# Altium footprint library PassiveComponents.PcbLib: 111 footprints (part 5 of 7)
Each footprint in its own frame and in the unit in brackets; x right, y up, seen from the top. Pads: shape width x height; smd on the part's side, far side on the other; paste and mask are expansions set on the pad; w line width, h text height; cw(c..) or ccw(c..) is an arc to the next point about the centre after c.
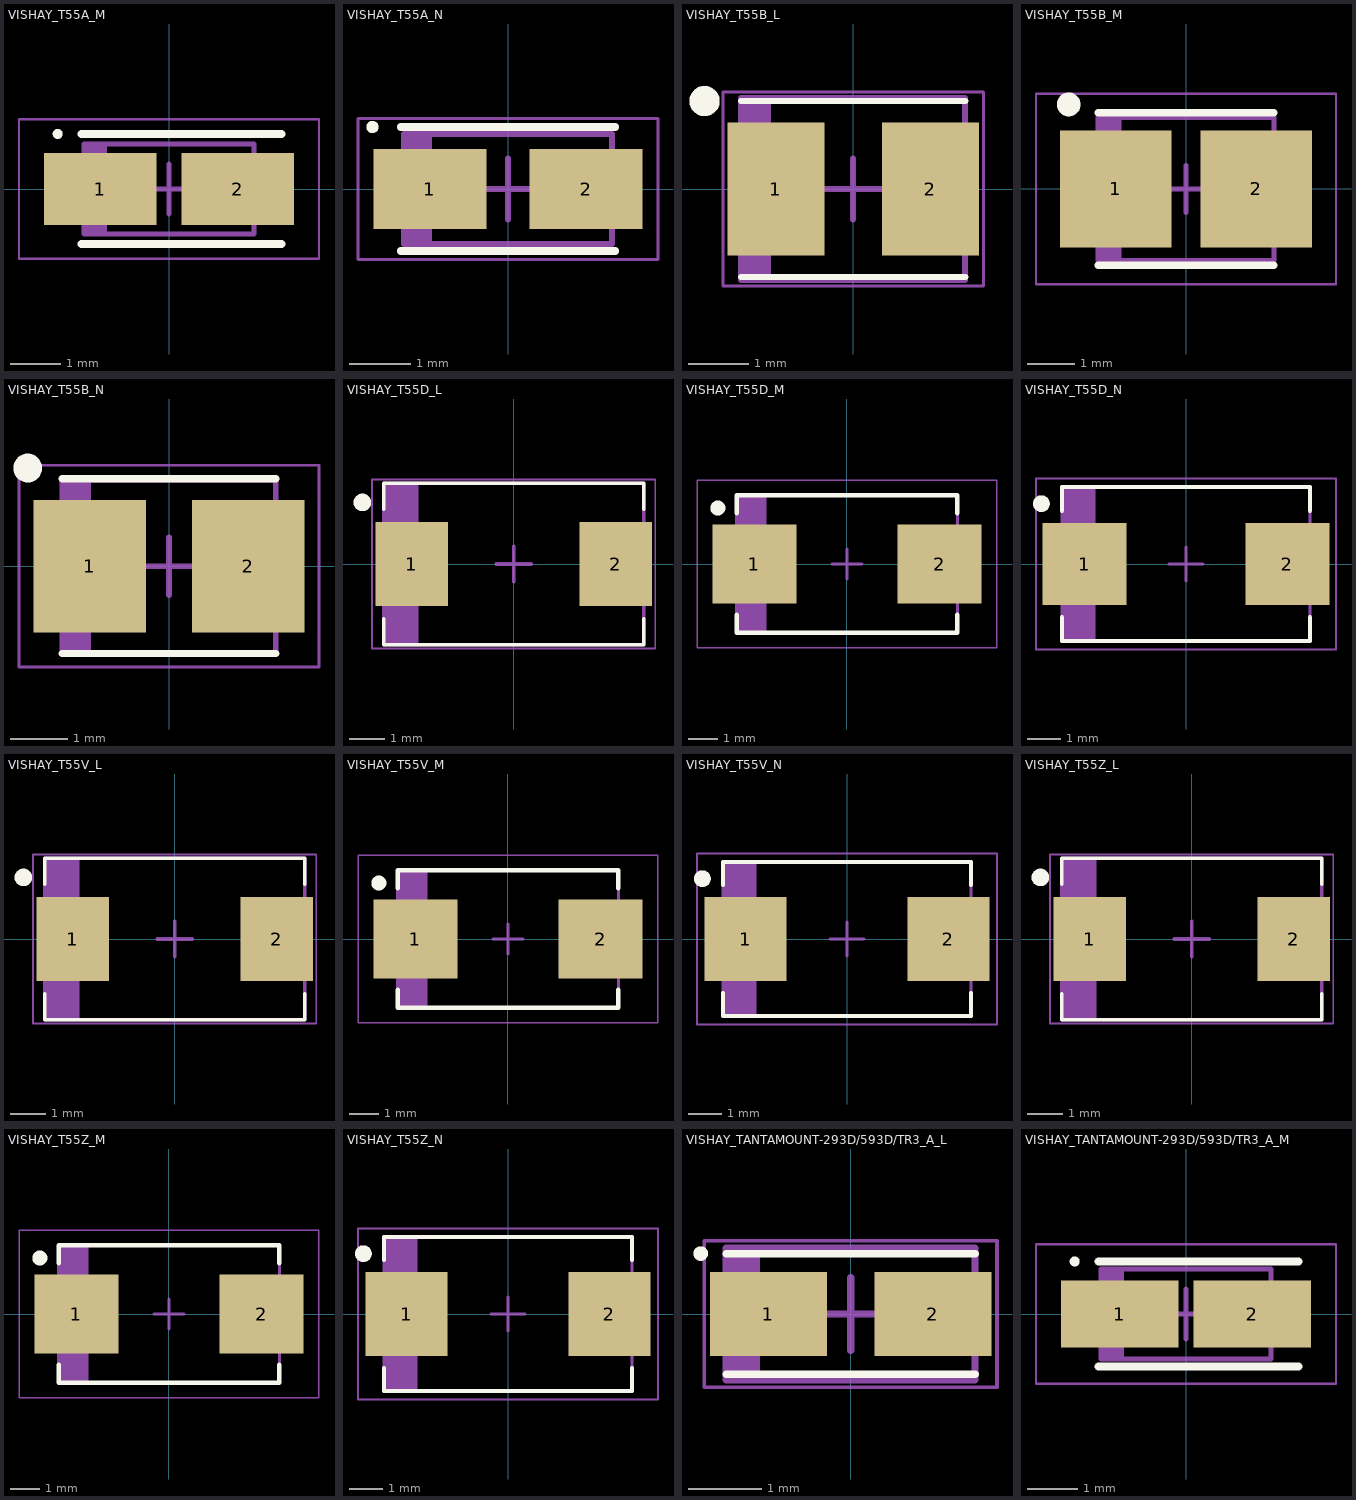
[diagram p4: the footprints below, top view; thin cyan lines are the x and y axes]

## VISHAY_T55A_M [mm] "Molded Capacitor, 2-Leads, Body 3.20x1.60mm, IPC Low Density"
height 1.8
pads (2):
  rect 2.25x1.45 smd mask+0.05: 1(-1.375,0) 2(1.375,0)
Top Overlay:
  circle w0.1: c-2.226,1.101 r0.05
  lines w0.152: -1.75,-1.101 2.25,-1.101 ; -1.75,1.101 2.25,1.101
Top Assembly:
  rectangle: -1.7,-0.9 -1.243,0.9
  lines w0.1: -1.7,-0.9 -1.7,0.9 1.7,0.9 1.7,-0.9 -1.7,-0.9
  text "'.Designator'" at -1.209,-0.113 h0.5
Top Courtyard:
  lines w0.05: -3,-1.4 -3,1.4 3,1.4 3,-1.4 -3,-1.4
  lines w0.1: -0.5,0 0.5,0 ; 0,-0.5 0,0.5
3D body "CAPMP3216X18M.step": height 1.8, standoff 0, extent -1.92,-0.9 1.92,0.9

## VISHAY_T55A_N [mm] "Molded Capacitor, 2-Leads, Body 3.20x1.60mm, IPC Medium Density"
height 1.8
pads (2):
  rect 1.85x1.3 smd mask+0.05: 1(-1.275,0) 2(1.275,0)
Top Overlay:
  circle w0.1: c-2.213,1.013 r0.05
  lines w0.127: -1.75,-1.013 1.75,-1.013 ; -1.75,1.013 1.75,1.013
Top Assembly:
  rectangle: -1.7,-0.9 -1.243,0.9
  lines w0.1: -1.7,-0.9 1.7,-0.9 1.7,0.9 -1.7,0.9 -1.7,-0.9
  text "'.Designator'" at -1.209,-0.113 h0.5
Top Courtyard:
  lines w0.05: -2.45,-1.15 2.45,-1.15 2.45,1.15 -2.45,1.15 -2.45,-1.15
  lines w0.1: -0.5,0 0.5,0 ; 0,-0.5 0,0.5
3D body "CAPMP3216X18N.step": height 1.8, standoff 0, extent -1.92,-0.9 1.92,0.9

## VISHAY_T55B_L [mm] "Molded Capacitor, 2-Leads, Body 3.50x2.80mm, IPC High Density"
height 2.1
pads (2):
  rect 1.6x2.2 smd mask+0.05: 1(-1.275,0) 2(1.275,0)
Top Overlay:
  circle w0.25: c-2.451,1.451 r0.125
  lines w0.102: -1.85,-1.451 1.85,-1.451 ; -1.85,1.451 1.85,1.451
Top Assembly:
  rectangle: -1.85,-1.5 -1.352,1.5
  lines w0.1: -1.85,-1.5 1.85,-1.5 1.85,1.5 -1.85,1.5 -1.85,-1.5
  text "'.Designator'" at -1.209,-0.113 h0.5
Top Courtyard:
  lines w0.05: -2.15,-1.6 2.15,-1.6 2.15,1.6 -2.15,1.6 -2.15,-1.6
  lines w0.1: -0.5,0 0.5,0 ; 0,-0.5 0,0.5
3D body "CAPMP3528X21L.step": height 2.1, standoff 0, extent -2.07,-1.5 2.07,1.5

## VISHAY_T55B_M [mm] "Molded Capacitor, 2-Leads, Body 3.50x2.80mm, IPC Low Density"
height 2.1
pads (2):
  rect 2.35x2.45 smd mask+0.05: 1(-1.475,0) 2(1.475,0)
Top Overlay:
  circle w0.25: c-2.464,1.775 r0.125
  lines w0.152: -1.85,-1.601 1.85,-1.601 ; -1.85,1.601 1.85,1.601
Top Assembly:
  rectangle: -1.85,-1.5 -1.352,1.5
  lines w0.1: -1.85,-1.5 -1.85,1.5 1.85,1.5 1.85,-1.5 -1.85,-1.5
  text "'.Designator'" at -1.209,-0.113 h0.5
Top Courtyard:
  lines w0.05: -3.15,-2 -3.15,2 3.15,2 3.15,-2 -3.15,-2
  lines w0.1: -0.5,0 0.5,0 ; 0,-0.5 0,0.5
3D body "CAPMP3528X21M.step": height 2.1, standoff 0, extent -2.07,-1.5 2.07,1.5

## VISHAY_T55B_N [mm] "Molded Capacitor, 2-Leads, Body 3.50x2.80mm, IPC Medium Density"
height 2.1
pads (2):
  rect 1.95x2.3 smd mask+0.05: 1(-1.375,0) 2(1.375,0)
Top Overlay:
  circle w0.25: c-2.449,1.7 r0.125
  lines w0.127: -1.85,-1.514 1.85,-1.514 ; -1.85,1.514 1.85,1.514
Top Assembly:
  rectangle: -1.85,-1.5 -1.352,1.5
  lines w0.1: -1.85,-1.5 -1.85,1.5 1.85,1.5 1.85,-1.5 -1.85,-1.5
  text "'.Designator'" at -1.209,-0.113 h0.5
Top Courtyard:
  lines w0.05: -2.6,-1.75 -2.6,1.75 2.6,1.75 2.6,-1.75 -2.6,-1.75
  lines w0.1: -0.5,0 0.5,0 ; 0,-0.5 0,0.5
3D body "CAPMP3528X21N.step": height 2.1, standoff 0, extent -2.07,-1.5 2.07,1.5

## VISHAY_T55D_L [mm] "Molded Capacitor, 2-Leads, Body 7.25x4.30mm, IPC High Density"
height 3.1
pads (2):
  rect 2.05x2.4 smd mask+0.05: 1(-2.9,0) 2(2.9,0)
Top Overlay:
  circle w0.25: c-4.301,1.75 r0.125
  lines w0.102: -3.7,-1.551 -3.7,-2.3 3.7,-2.3 3.7,-1.551 ; -3.7,1.551 -3.7,2.3 3.7,2.3 3.7,1.551
Top Assembly:
  rectangle: -3.7,-2.3 -2.705,2.3
  lines w0.1: -3.7,-2.3 3.7,-2.3 3.7,2.3 -3.7,2.3 -3.7,-2.3
  text "'.Designator'" at -1.209,-0.113 h0.5
Top Courtyard:
  lines w0.05: -4.025,-2.4 4.025,-2.4 4.025,2.4 -4.025,2.4 -4.025,-2.4
  lines w0.1: -0.5,0 0.5,0 ; 0,-0.5 0,0.5
3D body "CAPMP7243X31L.step": height 3.1, standoff 0, extent -3.92,-2.3 3.92,2.3

## VISHAY_T55D_M [mm] "Molded Capacitor, 2-Leads, Body 7.25x4.30mm, IPC Low Density"
height 3.1
pads (2):
  rect 2.8x2.65 smd mask+0.05: 1(-3.1,0) 2(3.1,0)
Top Overlay:
  circle w0.25: c-4.326,1.875 r0.125
  lines w0.152: -3.7,-1.701 -3.7,-2.3 3.7,-2.3 3.7,-1.701 ; -3.7,1.701 -3.7,2.3 3.7,2.3 3.7,1.701
Top Assembly:
  rectangle: -3.7,-2.3 -2.705,2.3
  lines w0.1: -3.7,-2.3 -3.7,2.3 3.7,2.3 3.7,-2.3 -3.7,-2.3
  text "'.Designator'" at -1.209,-0.113 h0.5
Top Courtyard:
  lines w0.05: -5.025,-2.8 -5.025,2.8 5.025,2.8 5.025,-2.8 -5.025,-2.8
  lines w0.1: -0.5,0 0.5,0 ; 0,-0.5 0,0.5
3D body "CAPMP7243X31M.step": height 3.1, standoff 0, extent -3.92,-2.3 3.92,2.3

## VISHAY_T55D_N [mm] "Molded Capacitor, 2-Leads, Body 7.25x4.30mm, IPC Medium Density"
height 3.1
pads (2):
  rect 2.5x2.45 smd mask+0.05: 1(-3.025,0) 2(3.025,0)
Top Overlay:
  circle w0.25: c-4.314,1.8 r0.125
  lines w0.127: -3.7,-1.589 -3.7,-2.3 3.7,-2.3 3.7,-1.589 ; -3.7,1.589 -3.7,2.3 3.7,2.3 3.7,1.589
Top Assembly:
  rectangle: -3.7,-2.3 -2.705,2.3
  lines w0.1: -3.7,-2.3 -3.7,2.3 3.7,2.3 3.7,-2.3 -3.7,-2.3
  text "'.Designator'" at -1.209,-0.113 h0.5
Top Courtyard:
  lines w0.05: -4.475,-2.55 -4.475,2.55 4.475,2.55 4.475,-2.55 -4.475,-2.55
  lines w0.1: -0.5,0 0.5,0 ; 0,-0.5 0,0.5
3D body "CAPMP7243X31N.step": height 3.1, standoff 0, extent -3.92,-2.3 3.92,2.3

## VISHAY_T55V_L [mm] "Molded Capacitor, 2-Leads, Body 7.25x4.30mm, IPC High Density"
height 2
pads (2):
  rect 2.05x2.4 smd mask+0.05: 1(-2.9,0) 2(2.9,0)
Top Overlay:
  circle w0.25: c-4.301,1.75 r0.125
  lines w0.102: -3.7,-1.551 -3.7,-2.3 3.7,-2.3 3.7,-1.551 ; -3.7,1.551 -3.7,2.3 3.7,2.3 3.7,1.551
Top Assembly:
  rectangle: -3.7,-2.3 -2.705,2.3
  lines w0.1: -3.7,-2.3 -3.7,2.3 3.7,2.3 3.7,-2.3 -3.7,-2.3
  text "'.Designator'" at -1.209,-0.113 h0.5
Top Courtyard:
  lines w0.05: -4.025,-2.4 -4.025,2.4 4.025,2.4 4.025,-2.4 -4.025,-2.4
  lines w0.1: -0.5,0 0.5,0 ; 0,-0.5 0,0.5
3D body "CAPMP7243X20L.step": height 2, standoff 0, extent -3.92,-2.3 3.92,2.3

## VISHAY_T55V_M [mm] "Molded Capacitor, 2-Leads, Body 7.25x4.30mm, IPC Low Density"
height 2
pads (2):
  rect 2.8x2.65 smd mask+0.05: 1(-3.1,0) 2(3.1,0)
Top Overlay:
  circle w0.25: c-4.326,1.875 r0.125
  lines w0.152: -3.7,-1.701 -3.7,-2.3 3.7,-2.3 3.7,-1.701 ; -3.7,1.701 -3.7,2.3 3.7,2.3 3.7,1.701
Top Assembly:
  rectangle: -3.7,-2.3 -2.705,2.3
  lines w0.1: -3.7,-2.3 3.7,-2.3 3.7,2.3 -3.7,2.3 -3.7,-2.3
  text "'.Designator'" at -1.209,-0.113 h0.5
Top Courtyard:
  lines w0.05: -5.025,-2.8 5.025,-2.8 5.025,2.8 -5.025,2.8 -5.025,-2.8
  lines w0.1: -0.5,0 0.5,0 ; 0,-0.5 0,0.5
3D body "CAPMP7243X20M.step": height 2, standoff 0, extent -3.92,-2.3 3.92,2.3

## VISHAY_T55V_N [mm] "Molded Capacitor, 2-Leads, Body 7.25x4.30mm, IPC Medium Density"
height 2
pads (2):
  rect 2.45x2.5 smd mask+0.05: 1(-3.025,0) 2(3.025,0)
Top Overlay:
  circle w0.25: c-4.314,1.8 r0.125
  lines w0.127: -3.7,-1.614 -3.7,-2.3 3.7,-2.3 3.7,-1.614 ; -3.7,1.614 -3.7,2.3 3.7,2.3 3.7,1.614
Top Assembly:
  rectangle: -3.7,-2.3 -2.705,2.3
  lines w0.1: -3.7,-2.3 3.7,-2.3 3.7,2.3 -3.7,2.3 -3.7,-2.3
  text "'.Designator'" at -1.209,-0.113 h0.5
Top Courtyard:
  lines w0.05: -4.475,-2.55 4.475,-2.55 4.475,2.55 -4.475,2.55 -4.475,-2.55
  lines w0.1: -0.5,0 0.5,0 ; 0,-0.5 0,0.5
3D body "CAPMP7243X20N.step": height 2, standoff 0, extent -3.92,-2.3 3.92,2.3

## VISHAY_T55Z_L [mm] "Molded Capacitor, 2-Leads, Body 7.25x4.30mm, IPC High Density"
height 1.9
pads (2):
  rect 2.05x2.4 smd mask+0.05: 1(-2.9,0) 2(2.9,0)
Top Overlay:
  circle w0.25: c-4.301,1.75 r0.125
  lines w0.102: -3.7,-1.551 -3.7,-2.3 3.7,-2.3 3.7,-1.551 ; -3.7,1.551 -3.7,2.3 3.7,2.3 3.7,1.551
Top Assembly:
  rectangle: -3.7,-2.3 -2.705,2.3
  lines w0.1: -3.7,-2.3 3.7,-2.3 3.7,2.3 -3.7,2.3 -3.7,-2.3
  text "'.Designator'" at -1.209,-0.113 h0.5
Top Courtyard:
  lines w0.05: -4.025,-2.4 4.025,-2.4 4.025,2.4 -4.025,2.4 -4.025,-2.4
  lines w0.1: -0.5,0 0.5,0 ; 0,-0.5 0,0.5
3D body "CAPMP7243X19L.step": height 1.9, standoff 0, extent -3.92,-2.3 3.92,2.3

## VISHAY_T55Z_M [mm] "Molded Capacitor, 2-Leads, Body 7.25x4.30mm, IPC Low Density"
height 1.9
pads (2):
  rect 2.8x2.65 smd mask+0.05: 1(-3.1,0) 2(3.1,0)
Top Overlay:
  circle w0.25: c-4.326,1.875 r0.125
  lines w0.152: -3.7,-1.701 -3.7,-2.3 3.7,-2.3 3.7,-1.701 ; -3.7,1.701 -3.7,2.3 3.7,2.3 3.7,1.701
Top Assembly:
  rectangle: -3.7,-2.3 -2.705,2.3
  lines w0.1: -3.7,-2.3 -3.7,2.3 3.7,2.3 3.7,-2.3 -3.7,-2.3
  text "'.Designator'" at -1.209,-0.113 h0.5
Top Courtyard:
  lines w0.05: -5.025,-2.8 -5.025,2.8 5.025,2.8 5.025,-2.8 -5.025,-2.8
  lines w0.1: -0.5,0 0.5,0 ; 0,-0.5 0,0.5
3D body "CAPMP7243X19M.step": height 1.9, standoff 0, extent -3.92,-2.3 3.92,2.3

## VISHAY_T55Z_N [mm] "Molded Capacitor, 2-Leads, Body 7.25x4.30mm, IPC Medium Density"
height 1.9
pads (2):
  rect 2.45x2.5 smd mask+0.05: 1(-3.025,0) 2(3.025,0)
Top Overlay:
  circle w0.25: c-4.314,1.8 r0.125
  lines w0.127: -3.7,-1.614 -3.7,-2.3 3.7,-2.3 3.7,-1.614 ; -3.7,1.614 -3.7,2.3 3.7,2.3 3.7,1.614
Top Assembly:
  rectangle: -3.7,-2.3 -2.705,2.3
  lines w0.1: -3.7,-2.3 -3.7,2.3 3.7,2.3 3.7,-2.3 -3.7,-2.3
  text "'.Designator'" at -1.209,-0.113 h0.5
Top Courtyard:
  lines w0.05: -4.475,-2.55 -4.475,2.55 4.475,2.55 4.475,-2.55 -4.475,-2.55
  lines w0.1: -0.5,0 0.5,0 ; 0,-0.5 0,0.5
3D body "CAPMP7243X19N.step": height 1.9, standoff 0, extent -3.92,-2.3 3.92,2.3

## VISHAY_TANTAMOUNT-293D/593D/TR3_A_L [mm] "Molded Capacitor, 2-Leads, Body 3.20x1.60mm, IPC High Density"
height 1.8
pads (2):
  rect 1.6x1.15 smd mask+0.05: 1(-1.125,0) 2(1.125,0)
Top Overlay:
  circle w0.1: c-2.051,0.826 r0.05
  lines w0.102: -1.7,-0.826 1.7,-0.826 ; -1.7,0.826 1.7,0.826
Top Assembly:
  rectangle: -1.7,-0.9 -1.243,0.9
  lines w0.1: -1.7,-0.9 -1.7,0.9 1.7,0.9 1.7,-0.9 -1.7,-0.9
  text "'.Designator'" at -1.209,-0.113 h0.5
Top Courtyard:
  lines w0.05: -2,-1 -2,1 2,1 2,-1 -2,-1
  lines w0.1: -0.5,0 0.5,0 ; 0,-0.5 0,0.5
3D body "CAPMP3216X18L.step": height 1.8, standoff 0, extent -1.92,-0.9 1.92,0.9

## VISHAY_TANTAMOUNT-293D/593D/TR3_A_M [mm] "Molded Capacitor, 2-Leads, Body 3.20x1.60mm, IPC Low Density"
height 1.8
pads (2):
  rect 2.35x1.35 smd mask+0.05: 1(-1.325,0) 2(1.325,0)
Top Overlay:
  circle w0.1: c-2.226,1.051 r0.05
  lines w0.152: -1.75,-1.051 2.25,-1.051 ; -1.75,1.051 2.25,1.051
Top Assembly:
  rectangle: -1.7,-0.9 -1.243,0.9
  lines w0.1: -1.7,-0.9 -1.7,0.9 1.7,0.9 1.7,-0.9 -1.7,-0.9
  text "'.Designator'" at -1.209,-0.113 h0.5
Top Courtyard:
  lines w0.05: -3,-1.4 -3,1.4 3,1.4 3,-1.4 -3,-1.4
  lines w0.1: -0.5,0 0.5,0 ; 0,-0.5 0,0.5
3D body "CAPMP3216X18M.step": height 1.8, standoff 0, extent -1.92,-0.9 1.92,0.9